# Altium footprint library TH_Connectors.PcbLib: 83 footprints (part 1 of 6)
Each footprint in its own frame and in the unit in brackets; x right, y up, seen from the top. Pads: shape width x height; smd on the part's side, far side on the other; paste and mask are expansions set on the pad; w line width, h text height; cw(c..) or ccw(c..) is an arc to the next point about the centre after c.
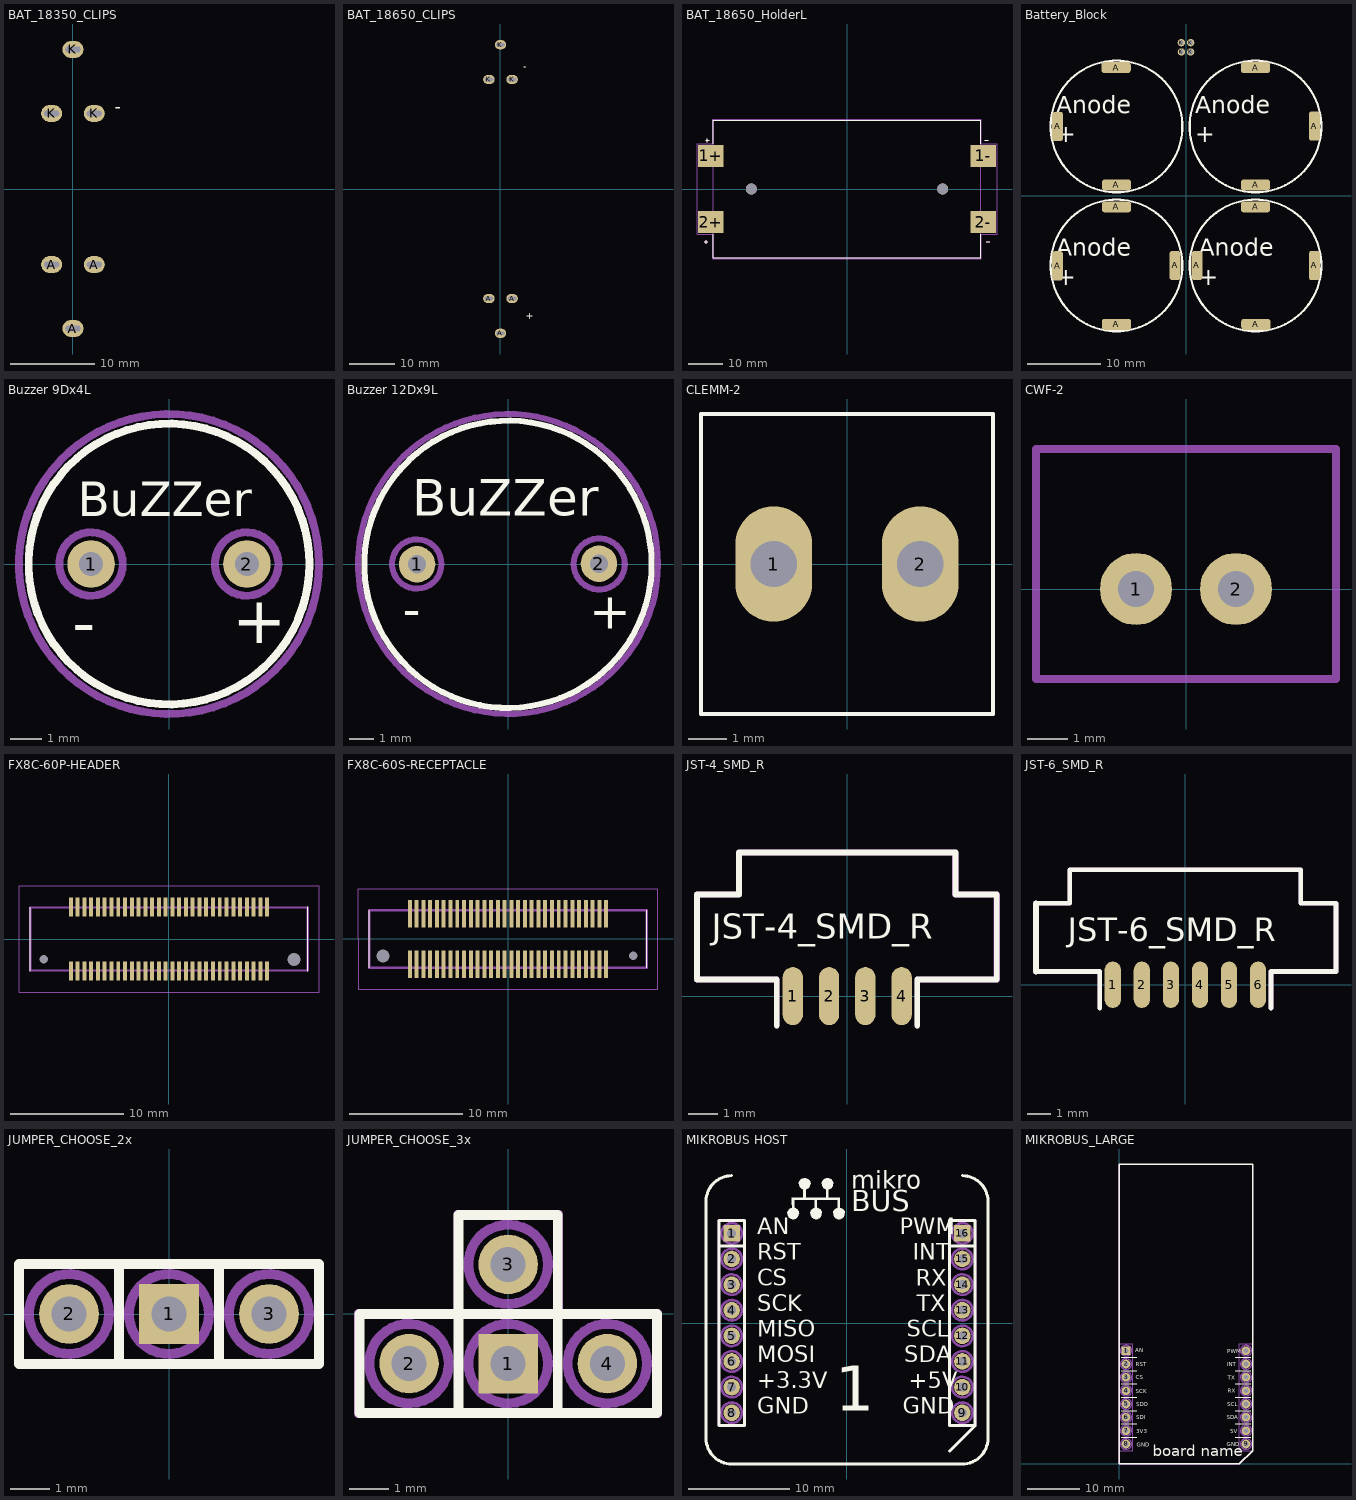
[diagram p0: the footprints below, top view; thin cyan lines are the x and y axes]

## BAT_18350_CLIPS [mm]
pads (6):
  oval 2.5x2 hole 0.7 slot 1.8 at 0 deg: A(-2.54,-9) A(0,-16.62) A(2.54,-9) K(-2.54,9) K(0,16.62) K(2.54,9)
Top Overlay:
  text "-" at 4.954,9.092 h1.52

## BAT_18650_CLIPS [mm]
pads (6):
  oval 2.5x2 hole 0.7 slot 1.8 at 0 deg unplated: A(-2.54,-24) A(0,-31.62) A(2.54,-24) K(-2.54,24) K(0,31.62) K(2.54,24)
Top Overlay:
  text "+" at 5.554,-28.5 h1.52
  text "-" at 4.954,26.092 h1.52
3D body "keystone-PN247.STEP": height 18.94, standoff -2.75, extent -10.287,-37.184 10.287,-22.2
3D body "keystone-PN247.STEP": height 18.94, standoff -2.75, extent -10.287,22.3 10.287,37.284
3D body "User Library-18650-1.STEP": height 21, standoff 3, extent -9,-32.75 9,32.35

## BAT_18650_HolderL [mm]
pads (6):
  rect 7.34x6.35 smd: 1+(-39.33,9.555) 1-(39.33,9.555) 2+(-39.33,-9.555) 2-(39.33,-9.555)
  round 3.17 hole 3.17 unplated: ""(-27.6,0) ""(27.6,0)
Top Overlay:
  lines w0.127: -38.53,-13.05 -38.53,-19.89 38.53,-19.89 38.53,-13.05 ; -38.53,13.05 -38.53,19.89 38.53,19.89 38.53,13.05
  lines w0.3: -41.14,-15.24 -40.14,-15.24 ; -40.75,14 -39.75,14 ; -40.64,-15.74 -40.64,-14.74 ; -40.25,13.5 -40.25,14.5 ; 39.75,14 40.75,14 ; 40.14,-15.24 41.14,-15.24
Top Assembly:
  lines w0.127: -38.53,-19.89 38.53,-19.89 38.53,19.89 -38.53,19.89 -38.53,-19.89
  lines w0.3: -41.14,-15.24 -40.14,-15.24 ; -40.75,14 -39.75,14 ; -40.64,-15.74 -40.64,-14.74 ; -40.25,13.5 -40.25,14.5 ; 39.75,14 40.75,14 ; 40.14,-15.24 41.14,-15.24
Top Courtyard:
  lines w0.05: -43.25,-13 -38.78,-13 -38.78,-20.14 38.78,-20.14 38.78,-13 43.25,-13 43.25,13 38.78,13 38.78,20.14 -38.78,20.14 -38.78,13 -43.25,13 -43.25,-13
3D body "User Library-Blossom 1048.STEP": height 15.43, standoff -0.98, extent -43.002,-19.888 43.002,19.888

## Battery_Block [mm]
height 1.2
pads (18):
  rrect50% 1.5x4 smd: A(-17.55,-9.55) A(-17.55,9.5) A(-1.5,-9.5) A(1.5,-9.5) A(17.55,-9.5) A(17.55,9.55)
  rrect50% 4x1.5 smd: A(-9.55,17.55) A(-9.5,-17.55) A(-9.5,-1.5) A(-9.5,1.5) A(9.5,17.55) A(9.5,-1.5) A(9.5,1.5) A(9.55,-17.55)
  round 1 hole 0.65: K(-0.635,19.685) K(-0.635,20.955) K(0.635,19.685) K(0.635,20.955)
Top Overlay:
  circle w0.3: c-9.5,-9.5 r9
  circle w0.3: c9.5,-9.5 r9
  circle w0.3: c9.5,9.5 r9
  circle w0.3: c-9.5,9.5 r9
  text "Anode / +" at 1.242,6.5 h4
  text "Anode / +" at 1.742,-13 h4
  text "Anode / +" at -17.758,-13 h4
  text "Anode / +" at -17.758,6.5 h4
3D body "Part1.stp": height 2.4, standoff 0, extent -17.75,-17.5 -1.25,-1.5
3D body "Part1.stp": height 2.4, standoff 0, extent -17.75,1.5 -1.25,17.5
3D body "Part1.stp": height 2.4, standoff 0, extent 1.25,1.5 17.75,17.5
3D body "Part1.stp": height 2.4, standoff 0, extent 1.25,-17.5 17.75,-1.5

## Buzzer 9Dx4L [mil]
pads (2):
  round 60 hole 30: 1(-98.43,0) 2(98.43,0)
Top Overlay:
  circle w10: c0,0 r177.17
  text "BuZZer" at -115,60 h43.31
  text "-" at -122.05,-102.36 h60
  text "+" at 80,-100 h60
Top Assembly:
  circle w10: c0,0 r189.32
Bottom Assembly:
  circle w10: c-98.42,0 r40.06
  circle w10: c98.01,0 r40.06

## Buzzer 12Dx9L [mil]
pads (2):
  round 60 hole 30: 1(-149.61,-0.49) 2(149.61,0.49)
Top Overlay:
  circle w10: c0,-0.49 r236.22
  text "+" at 133.86,-106.79 h60
  text "-" at -173.23,-102.85 h60
  text "BuZZer" at -157.48,79.23 h60
Bottom Courtyard:
  circle w10: c150,0 r42
  circle w10: c-150,0 r40.66
Top Assembly:
  circle w10: c0,0 r246.65
3D body "User Library-buzzer12.STEP": height 295.28, standoff -78.74, extent -236.22,-235.95 236.22,235.95

## CLEMM-2 [mm]
pads (2):
  oval 2x3 hole 1.2: 1(-1.905,0) 2(1.905,0)
Top Overlay:
  lines w0.1: -3.8,-3.9 -3.8,3.9 3.8,3.9 3.8,-3.9 -3.8,-3.9
Top Assembly:
  lines w0.1: -3.8,-3.9 3.8,-3.9 3.8,3.9 -3.8,3.9 -3.8,-3.9
Top Courtyard:
  lines w0.1: -3.8,-3.9 3.8,-3.9 3.8,3.9 -3.8,3.9 -3.8,-3.9

## CWF-2 [mm]
pads (2):
  round 1.8 hole 0.9: 1(-1.25,0) 2(1.25,0)
Top Assembly:
  lines w0.2: -3.75,-2.25 3.75,-2.25 3.75,3.5 -3.75,3.5 -3.75,-2.25
Top Courtyard:
  lines w0.2: -3.75,-2.25 3.75,-2.25 3.75,3.5 -3.75,3.5 -3.75,-2.25
3D body "DS1069-2 CWF-2.stp": height 7, standoff -3.5, extent -3.75,-2.2 3.75,3.55

## FX8C-60P-HEADER [mm]
height 1.3
pads (62):
  rect 0.35x1.7 smd: 1(8.7,2.85) 2(8.7,-2.85) 3(8.1,2.85) 4(8.1,-2.85) 5(7.5,2.85) 6(7.5,-2.85) 7(6.9,2.85) 8(6.9,-2.85) 9(6.3,2.85) 10(6.3,-2.85) 11(5.7,2.85) 12(5.7,-2.85) 13(5.1,2.85) 14(5.1,-2.85) 15(4.5,2.85) 16(4.5,-2.85) 17(3.9,2.85) 18(3.9,-2.85) 19(3.3,2.85) 20(3.3,-2.85) 21(2.7,2.85) 22(2.7,-2.85) 23(2.1,2.85) 24(2.1,-2.85) 25(1.5,2.85) 26(1.5,-2.85) 27(0.9,2.85) 28(0.9,-2.85) 29(0.3,2.85) 30(0.3,-2.85) 31(-0.3,2.85) 32(-0.3,-2.85) 33(-0.9,2.85) 34(-0.9,-2.85) 35(-1.5,2.85) 36(-1.5,-2.85) 37(-2.1,2.85) 38(-2.1,-2.85) 39(-2.7,2.85) 40(-2.7,-2.85) 41(-3.3,2.85) 42(-3.3,-2.85) 43(-3.9,2.85) 44(-3.9,-2.85) 45(-4.5,2.85) 46(-4.5,-2.85) 47(-5.1,2.85) 48(-5.1,-2.85) 49(-5.7,2.85) 50(-5.7,-2.85) 51(-6.3,2.85) 52(-6.3,-2.85) 53(-6.9,2.85) 54(-6.9,-2.85) 55(-7.5,2.85) 56(-7.5,-2.85) 57(-8.1,2.85) 58(-8.1,-2.85) 59(-8.7,2.85) 60(-8.7,-2.85)
  round 0.575 hole 1.15 unplated: MH1(11.1,-1.8)
  round 0.375 hole 0.75 unplated: MH2(-11.1,-1.8)
Top Overlay:
  lines w0.1: -12.3,-2.85 -12.3,2.8 ; 12.3,-2.85 12.3,2.85
Top Assembly:
  lines w0.2: -12.3,-2.8 -12.3,2.8 12.3,2.8 12.3,-2.8 -12.3,-2.8
Top Courtyard:
  lines w0.1: -13.3,-4.7 -13.3,4.7 13.3,4.7 13.3,-4.7 -13.3,-4.7
3D body "fx8c-60s-sv_91_.stp": height 3.95, standoff -0.8, extent -12.3,-3.5 12.3,3.5

## FX8C-60S-RECEPTACLE [mm]
height 1.3
pads (62):
  rect 0.35x2.45 smd: 1(-8.7,-2.225) 2(-8.7,2.225) 3(-8.1,-2.225) 4(-8.1,2.225) 5(-7.5,-2.225) 6(-7.5,2.225) 7(-6.9,-2.225) 8(-6.9,2.225) 9(-6.3,-2.225) 10(-6.3,2.225) 11(-5.7,-2.225) 12(-5.7,2.225) 13(-5.1,-2.225) 14(-5.1,2.225) 15(-4.5,-2.225) 16(-4.5,2.225) 17(-3.9,-2.225) 18(-3.9,2.225) 19(-3.3,-2.225) 20(-3.3,2.225) 21(-2.7,-2.225) 22(-2.7,2.225) 23(-2.1,-2.225) 24(-2.1,2.225) 25(-1.5,-2.225) 26(-1.5,2.225) 27(-0.9,-2.225) 28(-0.9,2.225) 29(-0.3,-2.225) 30(-0.3,2.225) 31(0.3,-2.225) 32(0.3,2.225) 33(0.9,-2.225) 34(0.9,2.225) 35(1.5,-2.225) 36(1.5,2.225) 37(2.1,-2.225) 38(2.1,2.225) 39(2.7,-2.225) 40(2.7,2.225) 41(3.3,-2.225) 42(3.3,2.225) 43(3.9,-2.225) 44(3.9,2.225) 45(4.5,-2.225) 46(4.5,2.225) 47(5.1,-2.225) 48(5.1,2.225) 49(5.7,-2.225) 50(5.7,2.225) 51(6.3,-2.225) 52(6.3,2.225) 53(6.9,-2.225) 54(6.9,2.225) 55(7.5,-2.225) 56(7.5,2.225) 57(8.1,-2.225) 58(8.1,2.225) 59(8.7,-2.225) 60(8.7,2.225)
  round 0.575 hole 1.15 unplated: MH1(-11.1,-1.5)
  round 0.375 hole 0.75 unplated: MH2(11.1,-1.5)
Top Overlay:
  lines w0.1: -12.3,-2.55 -12.3,2.55 ; 12.3,-2.55 12.3,2.55
Top Assembly:
  lines w0.2: -12.3,-2.55 -12.3,2.55 12.3,2.55 12.3,-2.55 -12.3,-2.55
Top Courtyard:
  lines w0.1: -13.3,-4.45 -13.3,4.45 13.3,4.45 13.3,-4.45 -13.3,-4.45
3D body "fx8c-60p-sv2_91_.stp": height 6.85, standoff -0.8, extent -12.281,-3.25 12.319,3.25

## JST-4_SMD_R [mm]
pads (4):
  oval 0.7x2 smd: 1(-1.875,0) 2(-0.625,0) 3(0.625,0) 4(1.875,0)
Top Overlay:
  lines w0.2: -2.433,-1.016 -2.433,0.57 -5.18,0.57 -5.18,3.504 -3.734,3.504 -3.734,4.953 3.734,4.953 3.734,3.504 5.154,3.504 5.154,0.57 2.413,0.57 2.413,-1.016
  text "JST-4_SMD_R" at -4.671,1.975 h0.85
Top Assembly:
  lines w0.2: -2.433,-1.016 -2.433,0.57 -5.18,0.57 -5.18,3.504 -3.734,3.504 -3.734,4.953 3.74,4.953 3.74,3.494 4.714,3.494 5.142,3.494 5.142,0.57 2.413,0.57 2.413,-1.016
Top Courtyard:
  lines w0.2: -2.433,-1.016 -2.433,0.57 -5.18,0.57 -5.18,3.504 -3.734,3.504 -3.734,4.953 3.721,4.953 3.721,3.504 5.164,3.504 5.164,0.57 2.413,0.57 2.413,-1.016
3D body "JST - GH - SMD (R) - 4Pin - 1.25mm.stp": height 3.53, standoff 0, extent -5.184,-0.572 5.144,4.775

## JST-6_SMD_R [mm]
pads (6):
  oval 0.7x2 smd: 1(-3.125,0) 2(-1.875,0) 3(-0.625,0) 4(0.625,0) 5(1.875,0) 6(3.125,0)
Top Overlay:
  lines w0.2: -6.43,0.57 -3.683,0.57 -3.683,-1.016 ; -6.43,3.504 -4.984,3.504 -4.984,4.953 4.953,4.953 4.953,3.504 6.477,3.504 6.477,0.57 3.683,0.57 3.683,-1.016
  lines w0.254: -6.43,0.57 -6.43,3.504
  text "JST-6_SMD_R" at -5.068,1.876 h1
Top Assembly:
  lines w0.2: -6.43,0.57 -3.683,0.57 -3.683,-1.016 ; -6.43,3.504 -4.984,3.504 -4.984,4.953 4.953,4.953 4.953,3.504 6.477,3.504 6.477,0.57 3.683,0.57 3.683,-1.016
  lines w0.254: -6.43,0.57 -6.43,3.504
Top Courtyard:
  lines w0.2: -6.43,0.57 -3.683,0.57 -3.683,-1.016 ; -6.43,3.504 -4.984,3.504 -4.984,4.953 4.953,4.953 4.953,3.504 6.477,3.504 6.477,0.57 3.683,0.57 3.683,-1.016
  lines w0.254: -6.43,0.57 -6.43,3.504
3D body "JST - GH - SMD (R) - 6Pin - 1.25mm.stp": height 3.53, standoff 0, extent -6.414,-0.445 6.414,4.902

## JUMPER_CHOOSE_2x [mil]
pads (3):
  rect 60x60 hole 35.43: 1(0,0)
  round 60 hole 35.43: 2(-100,0) 3(100,0)
Top Overlay:
  lines w10: -50,-50 150,-50 150,50 -50,50 -50,-50 ; -50,-50 50,-50 ; 50,-50 -150,-50 -150,50 50,50 50,-50
Top Assembly:
  lines w7.87: -150,-50 150,-50 150,50 -150,50 -150,-50
Bottom Assembly:
  circle w10: c100,0 r40.04
  circle w10: c0,0 r40.04
  circle w10: c-100,0 r40.04
3D body "PLS1.stp": height 336.22, standoff -118.11, extent -150,-50 -50,50
3D body "PLS1.stp": height 336.22, standoff -118.11, extent -50,-50 50,50
3D body "PLS1.stp": height 336.22, standoff -118.11, extent 50,-50 150,50

## JUMPER_CHOOSE_3x [mil]
pads (4):
  rect 60x60 hole 35.43: 1(0,-50)
  round 60 hole 35.43: 2(-100,-50) 3(0,50) 4(100,-50)
Top Overlay:
  lines w10: -50,-100 150,-100 150,0 -50,0 -50,-100 ; -50,-100 -50,100 50,100 50,-100 ; -50,-100 50,-100 ; 50,-100 -150,-100 -150,0 50,0 50,-100
Top Assembly:
  lines w7.87: -151.43,-101.2 151.07,-101.2 151.07,1 51.11,1 51.11,101.14 -51.26,101.14 -51.26,1.05 -151.43,1.05 -151.43,-101.2
Bottom Assembly:
  circle w10: c0,-50 r40.04
  circle w10: c100,-50 r40.04
  circle w10: c0,50 r40.04
  circle w10: c-100,-50 r40.04
3D body "PLS1.stp": height 336.22, standoff -118.11, extent 50,-100 150,0
3D body "PLS1.stp": height 336.22, standoff -118.11, extent -50,0 50,100
3D body "PLS1.stp": height 336.22, standoff -118.11, extent -50,-100 50,0
3D body "PLS1.stp": height 336.22, standoff -118.11, extent -150,-100 -50,0

## MIKROBUS HOST [mil]
height 47.24
pads (16):
  rect 65x65 hole 35: 1(-450,350) 16(450,350)
  round 65 hole 35: 2(-450,250) 3(-450,150) 4(-450,50) 5(-450,-50) 6(-450,-150) 7(-450,-250) 8(-450,-350) 9(450,-350) 10(450,-250) 11(450,-150) 12(450,-50) 13(450,50) 14(450,150) 15(450,250)
Top Overlay:
  drawing of 650 lines, arcs and shapes, not listed
  text "1" at -45,-400 h300
  text "BUS" at 17,408.51 h140
  text "mikro" at 17,500.54 h120
  text "PWM" at 206.79,325 h110
  text "AN" at -350,325 h110
  text "+5V" at 241,-275 h110
  text "GND" at 218,-375 h110
  text "TX" at 272.17,25 h110
  text "RX" at 268.67,125 h110
  text "INT" at 256.49,225 h110
  text "SCL" at 233.48,-75 h110
  text "GND" at -350,-375 h110
  text "+3.3V" at -350,-275 h110
  text "MOSI" at -350,-175 h110
  text "SCK" at -350,25 h110
  text "MISO" at -350,-75 h110
  text "CS" at -350,125 h110
  text "RST" at -350,225 h110
  text "SDA" at 224.28,-175 h110
Bottom Overlay:
  drawing of 645 lines, arcs and shapes, not listed
  text "1" at 35,-400 h300
  text "RST" at -232.51,225 h110
  text "CS" at -271,125 h110
  text "MISO" at -198.88,-75 h110
  text "SCK" at -225.77,25 h110
  text "MOSI" at -201.73,-175 h110
  text "+3.3V" at -190,-275 h110
  text "GND" at -220,-375 h110
  text "AN" at -269.64,325 h110
  text "SDA" at 350,-175 h110
  text "SCL" at 350,-75 h110
  text "INT" at 350,225 h110
  text "RX" at 350,125 h110
  text "TX" at 350,25 h110
  text "GND" at 350,-375 h110
  text "+5V" at 350,-275 h110
  text "PWM" at 350,325 h110
  text "BUS" at -20,410 h160
  text "mikro" at -20,520 h140
Top Assembly:
  lines w7.87: -502.21,-402.27 -502.21,401.64 -397.98,401.64 -397.98,-402.27 -502.21,-402.27 ; 397.79,-402.27 397.79,401.64 502.02,401.64 502.02,-402.27 397.79,-402.27
Bottom Assembly:
  circle w10: c-450,250 r40.04
  circle w10: c-450,150 r40.04
  circle w10: c-450,50 r40.04
  circle w10: c-450,-50 r40.04
  circle w10: c-450,-350 r40.04
  circle w10: c-450,-250 r40.04
  circle w10: c-450,-150 r40.04
  circle w10: c-450,350 r40.04
  circle w10: c450,350 r40.04
  circle w10: c450,250 r40.04
  circle w10: c450,150 r40.04
  circle w10: c450,50 r40.04
  circle w10: c450,-50 r40.04
  circle w10: c450,-350 r40.04
  circle w10: c450,-250 r40.04
  circle w10: c450,-150 r40.04
3D body "F1X8.stp": height 334.65, standoff -124.02, extent -499.21,-404.93 -400.78,404.92
3D body "F1X8.stp": height 334.65, standoff -124.02, extent 400.79,-404.93 499.22,404.92

## MIKROBUS_LARGE [mil]
height 47.24
pads (16):
  rect 65x65 hole 35: 1(50,850)
  round 65 hole 35: 2(50,750) 3(50,650) 4(50,550) 5(50,450) 6(50,350) 7(50,250) 8(50,150) 9(950,150) 10(950,250) 11(950,350) 12(950,450) 13(950,550) 14(950,650) 15(950,750) 16(950,850)
Top Overlay:
  lines w8: 15,200 130,200 ; 15,300 130,300 ; 15,400 130,400 ; 15,500 130,500 ; 15,600 130,600 ; 15,700 130,700 ; 15,800 130,800 ; 870,200 985,200 ; 870,300 985,300 ; 870,400 985,400 ; 870,500 985,500 ; 870,600 985,600 ; 870,700 985,700 ; 870,800 985,800
  lines w10: 0,0 0,2250 1000,2250 1000,100 900,0 0,0 ; 0,0 0,0
  text "GND" at 129.46,130.45 h30
  text "3V3" at 127.34,232.13 h30
  text "5V" at 831.69,228.95 h30
  text "SDI" at 128.39,334.87 h30
  text "AN" at 118.86,836.93 h30
  text "SCK" at 123.1,530.82 h30
  text "INT" at 809.45,734.19 h30
  text "RST" at 123.09,734.19 h30
  text "SDO" at 127.33,433.38 h30
  text "GND" at 805.21,131.51 h30
  text "SDA" at 804.15,335.93 h30
  text "SCL" at 810.51,432.32 h30
  text "RX" at 813.69,534 h30
  text "TX" at 811.57,630.38 h30
  text "CS" at 124.15,634.62 h30
  text "PWM" at 808.39,831.63 h30
  text "board name" at 249.51,29.08 h140
Bottom Overlay:
  lines w8: 3,100 100,100 100,900 3,900 ; 997,100 900,100 900,900 997,900
  text "SCL" at 860,430 h35
  text "INT" at 860,730 h35
  text "SDI" at 220,330 h35
  text "CS" at 195,630 h35
  text "GND" at 233,130 h35
  text "3V3" at 230,230 h35
  text "SDO" at 227.96,429.14 h35
  text "SDA" at 860,330 h35
  text "RST" at 215.24,728.89 h35
  text "PWM" at 860,830 h35
  text "GND" at 860,130 h35
  text "5V" at 860,230 h35
  text "RX" at 860,530 h35
  text "TX" at 860,630 h35
  text "AN" at 200,830 h35
  text "SCK" at 230,530 h35
Keep-Out Layer:
  lines w6: 0,0 0,2250 1000,2250 1000,100 900,0 0,0
Border:
  lines w7.87: 0,0 0,2250 1000,2250 1000,100 900,0 0,0
Top Assembly:
  circle w10: c950,850 r40.04
  circle w10: c950,750 r40.04
  circle w10: c950,650 r40.04
  circle w10: c950,550 r40.04
  circle w10: c950,450 r40.04
  circle w10: c950,350 r40.04
  circle w10: c950,250 r40.04
  circle w10: c950,150 r40.04
  circle w10: c50,150 r40.04
  circle w10: c50,250 r40.04
  circle w10: c50,350 r40.04
  circle w10: c50,450 r40.04
  circle w10: c50,550 r40.04
  circle w10: c50,650 r40.04
  circle w10: c50,750 r40.04
  circle w10: c50,850 r40.04
Bottom Assembly:
  lines w7.87: -2.21,97.73 -2.21,901.64 102.02,901.64 102.02,97.73 -2.21,97.73 ; 897.79,97.73 897.79,901.64 1002.02,901.64 1002.02,97.73 897.79,97.73
3D body "User Library-PinHeaderX3.STEP": height 81.88, standoff -398.04, extent 892.52,100 1007.48,400
3D body "User Library-PinHeaderX3.STEP": height 81.88, standoff -398.04, extent -7.96,100 107,400
3D body "User Library-PinHeaderX5-1.STEP": height 81.88, standoff -398.04, extent 892.52,400 1007.48,900
3D body "User Library-PinHeaderX5-1.STEP": height 81.88, standoff -398.04, extent -7.96,400 107,900